# Altium footprint library SWLIB(150721).PcbLib: 348 footprints (part 22 of 22)
Each footprint in its own frame and in the unit in brackets; x right, y up, seen from the top. Pads: shape width x height; smd on the part's side, far side on the other; paste and mask are expansions set on the pad; w line width, h text height; cw(c..) or ccw(c..) is an arc to the next point about the centre after c.
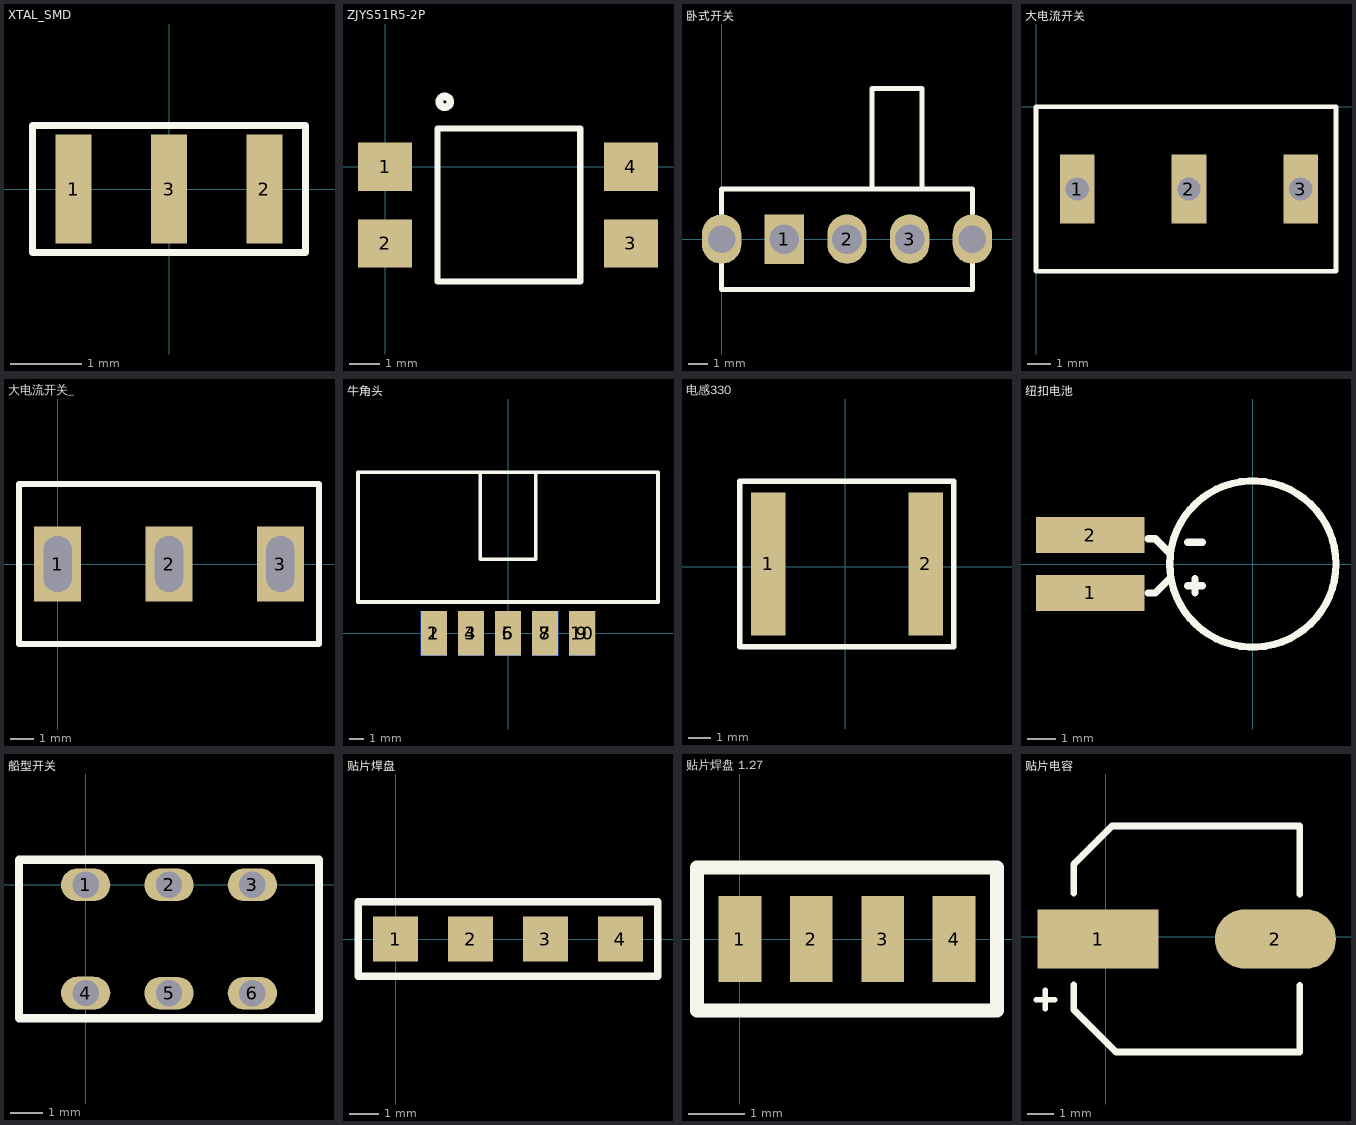
[diagram p21: the footprints below, top view; thin cyan lines are the x and y axes]

## XTAL_SMD [mil]
height 224.41
pads (3):
  rect 19.68x60 smd: 1(-52.5,0) 2(52.5,0) 3(0,0)
Top Overlay:
  lines w3.94: -75,-35 -75,35 -45,35 75,35 75,-35 -75,-35
3D body "User Library-CC5V-T1A_Tuning Fork Crystal.STEP": height 35.43, standoff -0.2, extent -80.71,-30 80.71,29.06

## ZJYS51R5-2P [mm]
pads (4):
  rect 1.8x1.6 smd: 1(0,0) 2(0,-2.54) 3(8.158,-2.54) 4(8.158,0)
Top Overlay:
  circle w0.254: c1.979,2.159 r0.18
  lines w0.2: 1.735,-3.81 6.477,-3.81 6.477,1.27 2.715,1.27 1.735,1.27 1.735,-3.81
3D body "TOSHIBA_11-4C1.STEP": height 2.6, standoff 0, extent 0.564,-3.146 7.564,0.454

## 卧式开关 [mm]
pads (5):
  rect 2x2.5 hole 1.5: 1(3.175,0)
  oval 2x2.5 hole 1.5: 2(6.35,0) 3(9.525,0)
  oval 2x2.5 hole 1.4: ""(0,0) ""(12.7,0)
Top Overlay:
  lines w0.254: 7.62,2.54 7.62,7.62 10.16,7.62 10.16,2.54 ; 0,-2.54 0,2.54 12.7,2.54 12.7,-2.54 0,-2.54

## 大电流开关 [mm]
pads (3):
  rect 1.5x3 hole 1 square: 1(1.778,-3.556) 2(6.604,-3.556) 3(11.43,-3.556)
Top Overlay:
  lines w0.203: 0,-7.112 12.954,-7.112 12.954,0 0,0 0,-7.112

## 大电流开关_ [mm]
height 4
pads (3):
  rect 2x3.2 hole 1.2 slot 2.4 at 90 deg: 1(0,0) 2(4.763,0) 3(9.525,0)
Top Overlay:
  lines w0.254: -1.651,-3.429 -1.651,3.429 11.176,3.429 11.176,-3.429 -1.651,-3.429

## 牛角头 [mil]
height 47.24
pads (10):
  rect 70x120 smd: 1(-200,0) 3(-100,0) 5(0,0) 7(100,0) 9(200,0)
  rect 70x120 smd far side: 2(-200,0) 4(-100,0) 6(0,0) 8(100,0) 10(200,0)
Top Overlay:
  lines w10: -75,435 -75,200 75,200 75,435 ; -405,85 -405,435 405,435 405,85 -405,85

## 电感330 [mil]
pads (2):
  rect 60x250 smd: 1(-135,5) 2(140.59,5)
Top Overlay:
  lines w10: -185,-140 190,-140 190,150 -185,150 -185,-140

## 纽扣电池 [mil]
pads (2):
  rect 150x50 smd: 1(-225,-40) 2(-225,40)
Top Overlay:
  circle w10: c0,0 r115
  lines w10: -145,-40 -135,-40 -115,-20 ; -145,35 -135,35 -115,15 ; -90,-30 -70,-30 ; -90,30 -70,30 ; -80,-40 -80,-20

## 船型开关 [mm] "2.54mm(电脑鼠)"
pads (6):
  oval 1.5x1 hole 0.8: 1(0,0) 2(2.54,0) 3(5.08,0) 4(0,-3.3) 5(2.54,-3.302) 6(5.08,-3.302)
Top Overlay:
  lines w0.254: -2.032,-4.064 -2.032,0.762 7.112,0.762 7.112,-4.064 -1.27,-4.064 -2.032,-4.064

## 贴片焊盘 [mil]
pads (4):
  rect 60x60 smd: 1(0,0) 2(100,0) 3(200,0) 4(300,0)
Top Overlay:
  lines w10: -50,-50 -50,50 350,50 350,-50 -50,-50

## 贴片焊盘 1.27 [mil]
pads (4):
  rect 30x60 smd: 1(0,0) 2(50,0) 3(100,0) 4(150,0)
Top Overlay:
  lines w10: -30,-50 -30,50 180,50 180,-50 -30,-50

## 贴片电容 [mm] "8*8"
pads (2):
  rect 4.5x2.2 smd: 1(-0.279,-0.076)
  oval 4.5x2.2 smd: 2(6.313,-0.076)
Top Overlay:
  lines w0.203: -2.583,-2.326 -2.233,-2.326 ; -2.233,-2.676 -2.233,-2.326 ; -2.233,-1.976 -2.233,-2.326 ; -1.883,-2.326 -2.233,-2.326
  lines w0.254: -1.183,-1.776 -1.183,-2.701 0.392,-4.276 7.217,-4.276 7.217,-1.801 ; -1.183,1.624 -1.183,2.699 0.242,4.124 7.217,4.124 7.217,1.599